# Altium footprint library Test.PcbLib: 245 footprints (part 11 of 17) (continued)
## QFN64LT-2 [mm] (continued)
3D body: height 0.76, standoff 0.75, extent -4.06,3.04 -3.04,4.06
3D body: height 0.75, standoff 0.01, extent -4.5,-4.5 4.5,4.5

## QFN64N [mm] "QFN, 64-Leads, Body 9,0x9,0mm (max), Pitch 0,50mm, IPC Medium Density"
height 1
pads (65):
  oval 0.85x0.28 smd mask+0.051: 1(-4.475,3.75) 2(-4.475,3.25) 3(-4.475,2.75) 4(-4.475,2.25) 5(-4.475,1.75) 6(-4.475,1.25) 7(-4.475,0.75) 8(-4.475,0.25) 9(-4.475,-0.25) 10(-4.475,-0.75) 11(-4.475,-1.25) 12(-4.475,-1.75) 13(-4.475,-2.25) 14(-4.475,-2.75) 15(-4.475,-3.25) 16(-4.475,-3.75) 33(4.475,-3.75) 34(4.475,-3.25) 35(4.475,-2.75) 36(4.475,-2.25) 37(4.475,-1.75) 38(4.475,-1.25) 39(4.475,-0.75) 40(4.475,-0.25) 41(4.475,0.25) 42(4.475,0.75) 43(4.475,1.25) 44(4.475,1.75) 45(4.475,2.25) 46(4.475,2.75) 47(4.475,3.25) 48(4.475,3.75)
  oval 0.28x0.85 smd mask+0.051: 17(-3.75,-4.475) 18(-3.25,-4.475) 19(-2.75,-4.475) 20(-2.25,-4.475) 21(-1.75,-4.475) 22(-1.25,-4.475) 23(-0.75,-4.475) 24(-0.25,-4.475) 25(0.25,-4.475) 26(0.75,-4.475) 27(1.25,-4.475) 28(1.75,-4.475) 29(2.25,-4.475) 30(2.75,-4.475) 31(3.25,-4.475) 32(3.75,-4.475) 49(3.75,4.475) 50(3.25,4.475) 51(2.75,4.475) 52(2.25,4.475) 53(1.75,4.475) 54(1.25,4.475) 55(0.75,4.475) 56(0.25,4.475) 57(-0.25,4.475) 58(-0.75,4.475) 59(-1.25,4.475) 60(-1.75,4.475) 61(-2.25,4.475) 62(-2.75,4.475) 63(-3.25,4.475) 64(-3.75,4.475)
  rect 7.4x7.4 smd paste-8 mask-8: 65(0,0)
via -3,3 diameter 0.65 hole 0.3
via -1.8,3 diameter 0.65 hole 0.3
via -0.6,3 diameter 0.65 hole 0.3
via 0.6,3 diameter 0.65 hole 0.3
via 1.8,3 diameter 0.65 hole 0.3
via 3,3 diameter 0.65 hole 0.3
via -3,1.8 diameter 0.65 hole 0.3
via -1.8,1.8 diameter 0.65 hole 0.3
via -0.6,1.8 diameter 0.65 hole 0.3
via 0.6,1.8 diameter 0.65 hole 0.3
via 1.8,1.8 diameter 0.65 hole 0.3
via 3,1.8 diameter 0.65 hole 0.3
via -3,0.6 diameter 0.65 hole 0.3
via -1.8,0.6 diameter 0.65 hole 0.3
via -0.6,0.6 diameter 0.65 hole 0.3
via 0.6,0.6 diameter 0.65 hole 0.3
via 1.8,0.6 diameter 0.65 hole 0.3
via 3,0.6 diameter 0.65 hole 0.3
via -3,-0.6 diameter 0.65 hole 0.3
via -1.8,-0.6 diameter 0.65 hole 0.3
via -0.6,-0.6 diameter 0.65 hole 0.3
via 0.6,-0.6 diameter 0.65 hole 0.3
via 1.8,-0.6 diameter 0.65 hole 0.3
via 3,-0.6 diameter 0.65 hole 0.3
via -3,-1.8 diameter 0.65 hole 0.3
via -1.8,-1.8 diameter 0.65 hole 0.3
via -0.6,-1.8 diameter 0.65 hole 0.3
via 0.6,-1.8 diameter 0.65 hole 0.3
via 1.8,-1.8 diameter 0.65 hole 0.3
via 3,-1.8 diameter 0.65 hole 0.3
via -3,-3 diameter 0.65 hole 0.3
via -1.8,-3 diameter 0.65 hole 0.3
via -0.6,-3 diameter 0.65 hole 0.3
via 0.6,-3 diameter 0.65 hole 0.3
via 1.8,-3 diameter 0.65 hole 0.3
via 3,-3 diameter 0.65 hole 0.3
Top Overlay:
  circle w0.25: c-5.45,3.75 r0.125
Top Paste:
  drawing of 49 lines, arcs and shapes, not listed
Top Solder:
  drawing of 36 lines, arcs and shapes, not listed
Mechanical 12:
  circle w0.4: c-3,3 r0.15
  circle w0.4: c-1.8,3 r0.15
  circle w0.4: c-0.6,3 r0.15
  circle w0.4: c0.6,3 r0.15
  circle w0.4: c1.8,3 r0.15
  circle w0.4: c3,3 r0.15
  circle w0.4: c-3,1.8 r0.15
  circle w0.4: c-1.8,1.8 r0.15
  circle w0.4: c-0.6,1.8 r0.15
  circle w0.4: c0.6,1.8 r0.15
  circle w0.4: c1.8,1.8 r0.15
  circle w0.4: c3,1.8 r0.15
  circle w0.4: c-3,0.6 r0.15
  circle w0.4: c-1.8,0.6 r0.15
  circle w0.4: c-0.6,0.6 r0.15
  circle w0.4: c0.6,0.6 r0.15
  circle w0.4: c1.8,0.6 r0.15
  circle w0.4: c3,0.6 r0.15
  circle w0.4: c-3,-0.6 r0.15
  circle w0.4: c-1.8,-0.6 r0.15
  circle w0.4: c-0.6,-0.6 r0.15
  circle w0.4: c0.6,-0.6 r0.15
  circle w0.4: c1.8,-0.6 r0.15
  circle w0.4: c3,-0.6 r0.15
  circle w0.4: c-3,-1.8 r0.15
  circle w0.4: c-1.8,-1.8 r0.15
  circle w0.4: c-0.6,-1.8 r0.15
  circle w0.4: c0.6,-1.8 r0.15
  circle w0.4: c1.8,-1.8 r0.15
  circle w0.4: c3,-1.8 r0.15
  circle w0.4: c-3,-3 r0.15
  circle w0.4: c-1.8,-3 r0.15
  circle w0.4: c-0.6,-3 r0.15
  circle w0.4: c0.6,-3 r0.15
  circle w0.4: c1.8,-3 r0.15
  circle w0.4: c3,-3 r0.15
Mechanical 13:
  circle w0.1: c-3.55,3.55 r0.5
  lines w0.1: -4.5,-4.5 -4.5,4.5 4.5,4.5 4.5,-4.5 -4.5,-4.5
Mechanical 15:
  lines w0.1: -0.5,0 0.5,0 ; 0,-0.5 0,0.5 ; -5.1,-5.1 -5.1,5.1 5.1,5.1 5.1,-5.1 -5.1,-5.1
3D body: height 1.01, standoff 1, extent -4.035,3.065 -3.015,4.085
3D body: height 1, standoff 0.01, extent -4.5,-4.5 4.5,4.5

## QFN65P400X400X100-16N [mm] "QFN 4x4mm 16pin R0.65mm"
height 1
pads (17):
  oval 0.75x0.35 smd mask+0.051: 1(-2,0.975) 2(-2,0.325) 3(-2,-0.325) 4(-2,-0.975) 9(2,-0.975) 10(2,-0.325) 11(2,0.325) 12(2,0.975)
  oval 0.35x0.75 smd mask+0.051: 5(-0.975,-2) 6(-0.325,-2) 7(0.325,-2) 8(0.975,-2) 13(0.975,2) 14(0.325,2) 15(-0.325,2) 16(-0.975,2)
  rect 2.7x2.7 smd paste-5 mask-5: 17(0,0)
via -0.6,0.6 diameter 0.65 hole 0.3
via 0.6,0.6 diameter 0.65 hole 0.3
via -0.6,-0.6 diameter 0.65 hole 0.3
via 0.6,-0.6 diameter 0.65 hole 0.3
Top Overlay:
  circle w0.25: c-2.425,1.7 r0.125
  lines w0.15: -2,-1.55 -2,-2 -1.55,-2 ; -2,1.55 -2,2 -1.55,2 ; 1.55,-2 2,-2 2,-1.55 ; 1.55,2 2,2 2,1.55
Top Paste:
  region: 1.325,1.325 1.325,0.75 0.925,0.75 0.75,0.925 0.75,1.325
  region: 0.45,1.325 0.45,0.925 0.275,0.75 -0.275,0.75 -0.45,0.925 -0.45,1.325
  region: 1.325,-1.325 0.75,-1.325 0.75,-0.925 0.925,-0.75 1.325,-0.75
  region: 1.325,-0.45 0.925,-0.45 0.75,-0.275 0.75,0.275 0.925,0.45 1.325,0.45
  region: -1.325,-1.325 -1.325,-0.75 -0.925,-0.75 -0.75,-0.925 -0.75,-1.325
  region: -0.45,-1.325 -0.45,-0.925 -0.275,-0.75 0.275,-0.75 0.45,-0.925 0.45,-1.325
  region: -0.45,0.275 -0.275,0.45 0.275,0.45 0.45,0.275 0.45,-0.275 0.275,-0.45 -0.275,-0.45 -0.45,-0.275
  region: -1.325,0.45 -0.925,0.45 -0.75,0.275 -0.75,-0.275 -0.925,-0.45 -1.325,-0.45
  region: -1.325,1.325 -0.75,1.325 -0.75,0.925 -0.925,0.75 -1.325,0.75
Top Solder:
  region: 1.4,1.4 0.6,1.4 0.6,0.931 0.473,0.906 0.366,0.834 0.294,0.727 0.269,0.6 0.275,0.6 0.269,0.6 0.294,0.473 0.366,0.366 0.473,0.294 0.6,0.269 0.6,0.275 0.6,0.269 0.727,0.294 0.834,0.366 0.906,0.473 0.931,0.6 0.906,0.727 0.834,0.834 0.727,0.906 0.6,0.931 0.6,0.925 0.6,1.4 0,1.4 0,0 1.4,0
  region: 1.4,-1.4 1.4,-0.6 0.931,-0.6 0.906,-0.473 0.834,-0.366 0.727,-0.294 0.6,-0.269 0.6,-0.275 0.6,-0.269 0.473,-0.294 0.366,-0.366 0.294,-0.473 0.269,-0.6 0.275,-0.6 0.269,-0.6 0.294,-0.727 0.366,-0.834 0.473,-0.906 0.6,-0.931 0.727,-0.906 0.834,-0.834 0.906,-0.727 0.931,-0.6 0.925,-0.6 1.4,-0.6 1.4,0 0,0 0,-1.4
  region: -1.4,-1.4 -0.6,-1.4 -0.6,-0.931 -0.473,-0.906 -0.366,-0.834 -0.294,-0.727 -0.269,-0.6 -0.275,-0.6 -0.269,-0.6 -0.294,-0.473 -0.366,-0.366 -0.473,-0.294 -0.6,-0.269 -0.6,-0.275 -0.6,-0.269 -0.727,-0.294 -0.834,-0.366 -0.906,-0.473 -0.931,-0.6 -0.906,-0.727 -0.834,-0.834 -0.727,-0.906 -0.6,-0.931 -0.6,-0.925 -0.6,-1.4 0,-1.4 0,0 -1.4,0
  region: -1.4,1.4 -1.4,0.6 -0.931,0.6 -0.906,0.473 -0.834,0.366 -0.727,0.294 -0.6,0.269 -0.6,0.275 -0.6,0.269 -0.473,0.294 -0.366,0.366 -0.294,0.473 -0.269,0.6 -0.275,0.6 -0.269,0.6 -0.294,0.727 -0.366,0.834 -0.473,0.906 -0.6,0.931 -0.727,0.906 -0.834,0.834 -0.906,0.727 -0.931,0.6 -0.925,0.6 -1.4,0.6 -1.4,0 0,0 0,1.4
Mechanical 12:
  circle w0.4: c-0.6,0.6 r0.15
  circle w0.4: c0.6,0.6 r0.15
  circle w0.4: c-0.6,-0.6 r0.15
  circle w0.4: c0.6,-0.6 r0.15
Mechanical 13:
  circle w0.1: c-1.25,1.3 r0.35
  lines w0.1: -2,-2 -2,2 2,2 2,-2 -2,-2
Mechanical 15:
  lines w0.1: -0.5,0 0.5,0 ; 0,-0.5 0,0.5 ; -2.8,-2.8 -2.8,2.8 2.8,2.8 2.8,-2.8 -2.8,-2.8
3D body: height 1, standoff 0.01, extent -2,-2 2,2
3D body: height 1.01, standoff 1, extent -1.607,0.943 -0.893,1.657

## QFN65P400X400X100-16N2 [mm] "QFN, 16-Leads, Body 4,0x4,0mm (max), Pitch 0,65mm, IPC Medium Density"
height 1
pads (17):
  oval 0.8x0.35 smd mask+0.051: 1(-1.95,0.975) 2(-1.95,0.325) 3(-1.95,-0.325) 4(-1.95,-0.975) 9(1.95,-0.975) 10(1.95,-0.325) 11(1.95,0.325) 12(1.95,0.975)
  oval 0.35x0.8 smd mask+0.051: 5(-0.975,-1.95) 6(-0.325,-1.95) 7(0.325,-1.95) 8(0.975,-1.95) 13(0.975,1.95) 14(0.325,1.95) 15(-0.325,1.95) 16(-0.975,1.95)
  rect 2.1x2.1 smd paste-7 mask-7: 17(0,0)
via -0.6,0.6 diameter 0.6 hole 0.3
via 0.6,0.6 diameter 0.6 hole 0.3
via -0.6,-0.6 diameter 0.6 hole 0.3
via 0.6,-0.6 diameter 0.6 hole 0.3
Top Overlay:
  circle w0.25: c-2.9,0.975 r0.125
  lines w0.15: -2,-1.55 -1.55,-2 ; -2,1.55 -1.55,2 ; 1.55,-2 2,-1.55 ; 1.55,2 2,1.55
Top Paste:
  region: -0.525,0.3 -0.3,0.525 0.3,0.525 0.525,0.3 0.525,-0.3 0.3,-0.525 -0.3,-0.525 -0.525,-0.3
  region: -0.525,1.025 -0.525,0.9 -0.3,0.675 0.3,0.675 0.525,0.9 0.525,1.025
  region: 1.025,-0.525 0.9,-0.525 0.675,-0.3 0.675,0.3 0.9,0.525 1.025,0.525
  region: -0.525,-1.025 -0.525,-0.9 -0.3,-0.675 0.3,-0.675 0.525,-0.9 0.525,-1.025
  region: -1.025,-0.525 -0.9,-0.525 -0.675,-0.3 -0.675,0.3 -0.9,0.525 -1.025,0.525
  region: -1.025,-0.75 -1.025,-1.025 -0.75,-1.025 -0.75,-0.85 -0.85,-0.75
  region: 0.75,-1.025 1.025,-1.025 1.025,-0.75 0.85,-0.75 0.75,-0.85
  region: 1.025,0.75 1.025,1.025 0.75,1.025 0.75,0.85 0.85,0.75
  region: -0.75,1.025 -1.025,1.025 -1.025,0.75 -0.85,0.75 -0.75,0.85
Top Solder:
  circle w0.102: c-0.6,0.6 r0.356
  circle w0.102: c0.6,0.6 r0.356
  circle w0.102: c0.6,-0.6 r0.356
  circle w0.102: c-0.6,-0.6 r0.356
  region: -1.1,1.1 0,1.1 0,0 -0.6,0 -0.6,0.225 -0.525,0.225 -0.45,0.3 -0.4,0.3 -0.275,0.425 -0.275,0.569 -0.244,0.6 -0.275,0.631 -0.275,0.775 -0.425,0.925 -0.625,0.925 -0.65,0.95 -0.675,0.925 -0.8,0.925 -0.925,0.8 -0.925,0.65 -0.95,0.625 -0.95,0.475 -0.85,0.375 -0.85,0.35 -0.825,0.35 -0.7,0.225 -0.6,0.225 -0.6,0 -1.1,0
  region: 1.1,1.1 0,1.1 0,0 0.6,0 0.6,0.225 0.525,0.225 0.45,0.3 0.4,0.3 0.275,0.425 0.275,0.569 0.244,0.6 0.275,0.631 0.275,0.775 0.425,0.925 0.625,0.925 0.65,0.95 0.675,0.925 0.8,0.925 0.925,0.8 0.925,0.65 0.95,0.625 0.95,0.475 0.85,0.375 0.85,0.35 0.825,0.35 0.7,0.225 0.6,0.225 0.6,0 1.1,0
  region: 1.1,-1.1 0,-1.1 0,0 0.6,0 0.6,-0.225 0.525,-0.225 0.45,-0.3 0.4,-0.3 0.275,-0.425 0.275,-0.569 0.244,-0.6 0.275,-0.631 0.275,-0.775 0.425,-0.925 0.625,-0.925 0.65,-0.95 0.675,-0.925 0.8,-0.925 0.925,-0.8 0.925,-0.65 0.95,-0.625 0.95,-0.475 0.85,-0.375 0.85,-0.35 0.825,-0.35 0.7,-0.225 0.6,-0.225 0.6,0 1.1,0
  region: -1.1,-1.1 0,-1.1 0,0 -0.6,0 -0.6,-0.225 -0.525,-0.225 -0.45,-0.3 -0.4,-0.3 -0.275,-0.425 -0.275,-0.569 -0.244,-0.6 -0.275,-0.631 -0.275,-0.775 -0.425,-0.925 -0.625,-0.925 -0.65,-0.95 -0.675,-0.925 -0.8,-0.925 -0.925,-0.8 -0.925,-0.65 -0.95,-0.625 -0.95,-0.475 -0.85,-0.375 -0.85,-0.35 -0.825,-0.35 -0.7,-0.225 -0.6,-0.225 -0.6,0 -1.1,0
Mechanical 12:
  circle w0.4: c-0.6,0.6 r0.15
  circle w0.4: c0.6,0.6 r0.15
  circle w0.4: c-0.6,-0.6 r0.15
  circle w0.4: c0.6,-0.6 r0.15
Mechanical 13:
  circle w0.1: c-1.25,1.3 r0.35
  lines w0.1: -2,-1.4 -1.4,-2 1.4,-2 2,-1.4 2,1.4 1.4,2 -1.4,2 -2,1.4 -2,-1.4
Mechanical 15:
  lines w0.1: -0.5,0 0.5,0 ; 0,-0.5 0,0.5 ; -2.6,-1.6 -1.6,-2.6 1.575,-2.6 2.6,-1.575 2.6,1.6 1.6,2.6 -1.6,2.6 -2.6,1.6 -2.6,-1.6
3D body: height 1, standoff 0.02, extent -2,-2 2,2
3D body: height 1.01, standoff 1, extent -1.607,0.943 -0.893,1.657

## QFN65P500X500X100-20M [mm] "QFN, 20-Leads, Body 5,0x5,0mm (max), Pitch 0,65mm, IPC Low Density"
height 1
pads (21):
  oval 0.9x0.35 smd mask+0.051: 1(-2.5,1.3) 2(-2.5,0.65) 3(-2.5,0) 4(-2.5,-0.65) 5(-2.5,-1.3) 11(2.5,-1.3) 12(2.5,-0.65) 13(2.5,0) 14(2.5,0.65) 15(2.5,1.3)
  oval 0.35x0.9 smd mask+0.051: 6(-1.3,-2.5) 7(-0.65,-2.5) 8(0,-2.5) 9(0.65,-2.5) 10(1.3,-2.5) 16(1.3,2.5) 17(0.65,2.5) 18(0,2.5) 19(-0.65,2.5) 20(-1.3,2.5)
  rect 3.3x3.3 smd paste-5 mask-5: 21(0,0)
via 1.2,-1.2 diameter 0.65 hole 0.3
via 0,-1.2 diameter 0.65 hole 0.3
via -1.2,-1.2 diameter 0.65 hole 0.3
via 1.2,0 diameter 0.65 hole 0.3
via 0,0 diameter 0.65 hole 0.3
via -1.2,0 diameter 0.65 hole 0.3
via 1.2,1.2 diameter 0.65 hole 0.3
via 0,1.2 diameter 0.65 hole 0.3
via -1.2,1.2 diameter 0.65 hole 0.3
Top Overlay:
  circle w0.25: c-2.944,2.007 r0.125
  lines w0.15: -2.5,-2.05 -2.5,-2.5 -2.05,-2.5 ; -2.5,2.05 -2.5,2.5 -2.05,2.5 ; 2.05,-2.5 2.5,-2.5 2.5,-2.05 ; 2.05,2.5 2.5,2.5 2.5,2.05
Top Paste:
  region: -0.875,1.05 -1.05,0.875 -1.05,0.325 -0.875,0.15 -0.325,0.15 -0.15,0.325 -0.15,0.875 -0.325,1.05
  region: -1.625,0.15 -1.525,0.15 -1.35,0.325 -1.35,0.875 -1.525,1.05 -1.625,1.05
  region: -1.35,1.525 -1.525,1.35 -1.625,1.35 -1.625,1.625 -1.35,1.625
  region: -1.525,-1.35 -1.35,-1.525 -1.35,-1.625 -1.625,-1.625 -1.625,-1.35
  region: 1.35,-1.525 1.525,-1.35 1.625,-1.35 1.625,-1.625 1.35,-1.625
  region: 1.525,1.35 1.35,1.525 1.35,1.625 1.625,1.625 1.625,1.35
  region: -1.625,-1.05 -1.525,-1.05 -1.35,-0.875 -1.35,-0.325 -1.525,-0.15 -1.625,-0.15
  region: 1.05,-1.625 1.05,-1.525 0.875,-1.35 0.325,-1.35 0.15,-1.525 0.15,-1.625
  region: -0.15,-1.625 -0.15,-1.525 -0.325,-1.35 -0.875,-1.35 -1.05,-1.525 -1.05,-1.625
  region: 1.625,1.05 1.525,1.05 1.35,0.875 1.35,0.325 1.525,0.15 1.625,0.15
  region: 1.625,-0.15 1.525,-0.15 1.35,-0.325 1.35,-0.875 1.525,-1.05 1.625,-1.05
  region: -1.05,1.625 -1.05,1.525 -0.875,1.35 -0.325,1.35 -0.15,1.525 -0.15,1.625
  region: 0.15,1.625 0.15,1.525 0.325,1.35 0.875,1.35 1.05,1.525 1.05,1.625
  region: 0.325,1.05 0.15,0.875 0.15,0.325 0.325,0.15 0.875,0.15 1.05,0.325 1.05,0.875 0.875,1.05
  region: 0.325,-0.15 0.15,-0.325 0.15,-0.875 0.325,-1.05 0.875,-1.05 1.05,-0.875 1.05,-0.325 0.875,-0.15
  region: -0.875,-0.15 -1.05,-0.325 -1.05,-0.875 -0.875,-1.05 -0.325,-1.05 -0.15,-0.875 -0.15,-0.325 -0.325,-0.15
Top Solder:
  drawing of 9 lines, arcs and shapes, not listed
Mechanical 13:
  circle w0.1: c-1.55,1.55 r0.5
  lines w0.1: -2.5,-2.5 2.5,-2.5 2.5,2.5 -2.5,2.5 -2.5,-2.5
Mechanical 15:
  lines w0.1: -0.5,0 0.5,0 ; 0,-0.5 0,0.5 ; -3.2,-3.2 3.2,-3.2 3.2,3.2 -3.2,3.2 -3.2,-3.2
3D body: height 1.01, standoff 1, extent -2.06,1.04 -1.04,2.06
3D body: height 1, standoff 0.02, extent -2.5,-2.5 2.5,2.5

## QFN65P600X600X100-28N [mm] "QFN, 28-Leads, Body 6,0x6,0mm (max), Pitch 0,65mm, IPC Medium Density"
height 1
pads (29):
  oval 0.65x0.35 smd mask+0.051: 1(-3.025,1.95) 2(-3.025,1.3) 3(-3.025,0.65) 4(-3.025,0) 5(-3.025,-0.65) 6(-3.025,-1.3) 7(-3.025,-1.95) 15(3.025,-1.95) 16(3.025,-1.3) 17(3.025,-0.65) 18(3.025,0) 19(3.025,0.65) 20(3.025,1.3) 21(3.025,1.95)
  oval 0.35x0.65 smd mask+0.051: 8(-1.95,-3.025) 9(-1.3,-3.025) 10(-0.65,-3.025) 11(0,-3.025) 12(0.65,-3.025) 13(1.3,-3.025) 14(1.95,-3.025) 22(1.95,3.025) 23(1.3,3.025) 24(0.65,3.025) 25(0,3.025) 26(-0.65,3.025) 27(-1.3,3.025) 28(-1.95,3.025)
  rect 4.7x4.7 smd paste-5 mask-5: 29(0,0)
via 0.6,-1.8 diameter 0.6 hole 0.3
via -0.6,-1.8 diameter 0.6 hole 0.3
via -1.8,-1.8 diameter 0.6 hole 0.3
via 1.8,-0.6 diameter 0.6 hole 0.3
via 0.6,-0.6 diameter 0.6 hole 0.3
via -0.6,-0.6 diameter 0.6 hole 0.3
via -1.8,-0.6 diameter 0.6 hole 0.3
via 1.8,0.6 diameter 0.6 hole 0.3
via 0.6,0.6 diameter 0.6 hole 0.3
via -1.8,0.6 diameter 0.6 hole 0.3
via 1.8,1.8 diameter 0.6 hole 0.3
via 0.6,1.8 diameter 0.6 hole 0.3
via -0.6,1.8 diameter 0.6 hole 0.3
via -1.8,1.8 diameter 0.6 hole 0.3
via -0.6,0.6 diameter 0.6 hole 0.3
via 1.8,-1.8 diameter 0.6 hole 0.3
Top Overlay:
  circle w0.25: c-3.45,2.575 r0.125
  lines w0.15: -3,-2.55 -3,-3 -2.55,-3 ; -3,2.55 -3,3 -2.55,3 ; 2.55,-3 3,-3 3,-2.55 ; 2.55,3 3,3 3,2.55
Top Paste:
  drawing of 25 lines, arcs and shapes, not listed
Top Solder:
  drawing of 2 lines, arcs and shapes, not listed
Mechanical 13:
  circle w0.1: c-2.05,2.05 r0.5
  lines w0.1: -3,-3 3,-3 3,3 -3,3 -3,-3
Mechanical 15:
  lines w0.1: -0.5,0 0.5,0 ; 0,-0.5 0,0.5 ; -3.6,-3.6 3.6,-3.6 3.6,3.6 -3.6,3.6 -3.6,-3.6
3D body: height 1, standoff 0.02, extent -3,-3 3,3
3D body: height 1.01, standoff 1, extent -2.56,1.54 -1.54,2.56

## QFP64A_M [mm] "Thin QFP, 64-Leads, Body 14x14mm, Pitch 0.8mm, IPC Low Density"
height 1.2
pads (64):
  rrect35% 2.05x0.533 smd mask+0.051: 1(-7.7,6)
  oval 2.05x0.533 smd mask+0.051: 2(-7.7,5.2) 3(-7.7,4.4) 4(-7.7,3.6) 5(-7.7,2.8) 6(-7.7,2) 7(-7.7,1.2) 8(-7.7,0.4) 9(-7.7,-0.4) 10(-7.7,-1.2) 11(-7.7,-2) 12(-7.7,-2.8) 13(-7.7,-3.6) 14(-7.7,-4.4) 15(-7.7,-5.2) 16(-7.7,-6) 33(7.7,-6) 34(7.7,-5.2) 35(7.7,-4.4) 36(7.7,-3.6) 37(7.7,-2.8) 38(7.7,-2) 39(7.7,-1.2) 40(7.7,-0.4) 41(7.7,0.4) 42(7.7,1.2) 43(7.7,2) 44(7.7,2.8) 45(7.7,3.6) 46(7.7,4.4) 47(7.7,5.2) 48(7.7,6)
  oval 0.533x2.05 smd mask+0.051: 17(-6,-7.7) 18(-5.2,-7.7) 19(-4.4,-7.7) 20(-3.6,-7.7) 21(-2.8,-7.7) 22(-2,-7.7) 23(-1.2,-7.7) 24(-0.4,-7.7) 25(0.4,-7.7) 26(1.2,-7.7) 27(2,-7.7) 28(2.8,-7.7) 29(3.6,-7.7) 30(4.4,-7.7) 31(5.2,-7.7) 32(6,-7.7) 49(6,7.7) 50(5.2,7.7) 51(4.4,7.7) 52(3.6,7.7) 53(2.8,7.7) 54(2,7.7) 55(1.2,7.7) 56(0.4,7.7) 57(-0.4,7.7) 58(-1.2,7.7) 59(-2,7.7) 60(-2.8,7.7) 61(-3.6,7.7) 62(-4.4,7.7) 63(-5.2,7.7) 64(-6,7.7)
Top Overlay:
  circle w0.25: c-7.7,6.85 r0.125
  circle w0.6: c-5.25,5.25 r0.3
  lines w0.2: -6.25,-6.25 -6.25,6.25 6.25,6.25 6.25,-6.25 -6.25,-6.25
Mechanical 13:
  circle w0.1: c-6.1,6.1 r0.5
  lines w0.1: -7,-7 -7,7 7,7 7,-7 -7,-7
Mechanical 15:
  lines w0.1: -0.5,0 0.5,0 ; 0,-0.5 0,0.5 ; -9.2,-9.2 -9.2,9.2 9.2,9.2 9.2,-9.2 -9.2,-9.2
3D body: height 1.2, standoff 0, extent -7,-7 7,7

## QFP80_M [mm] "QFP, 80-Leads, Body 14 x 14mm, Pitch 0.65mm, IPC Low Density"
height 2.45
pads (81):
  oval 2.25x0.43 smd mask+0.051: 1(-8.2,6.175) 2(-8.2,5.525) 3(-8.2,4.875) 4(-8.2,4.225) 5(-8.2,3.575) 6(-8.2,2.925) 7(-8.2,2.275) 8(-8.2,1.625) 9(-8.2,0.975) 10(-8.2,0.325) 11(-8.2,-0.325) 12(-8.2,-0.975) 13(-8.2,-1.625) 14(-8.2,-2.275) 15(-8.2,-2.925) 16(-8.2,-3.575) 17(-8.2,-4.225) 18(-8.2,-4.875) 19(-8.2,-5.525) 20(-8.2,-6.175) 41(8.2,-6.175) 42(8.2,-5.525) 43(8.2,-4.875) 44(8.2,-4.225) 45(8.2,-3.575) 46(8.2,-2.925) 47(8.2,-2.275) 48(8.2,-1.625) 49(8.2,-0.975) 50(8.2,-0.325) 51(8.2,0.325) 52(8.2,0.975) 53(8.2,1.625) 54(8.2,2.275) 55(8.2,2.925) 56(8.2,3.575) 57(8.2,4.225) 58(8.2,4.875) 59(8.2,5.525) 60(8.2,6.175)
  oval 0.43x2.25 smd mask+0.051: 21(-6.175,-8.2) 22(-5.525,-8.2) 23(-4.875,-8.2) 24(-4.225,-8.2) 25(-3.575,-8.2) 26(-2.925,-8.2) 27(-2.275,-8.2) 28(-1.625,-8.2) 29(-0.975,-8.2) 30(-0.325,-8.2) 31(0.325,-8.2) 32(0.975,-8.2) 33(1.625,-8.2) 34(2.275,-8.2) 35(2.925,-8.2) 36(3.575,-8.2) 37(4.225,-8.2) 38(4.875,-8.2) 39(5.525,-8.2) 40(6.175,-8.2) 61(6.175,8.2) 62(5.525,8.2) 63(4.875,8.2) 64(4.225,8.2) 65(3.575,8.2) 66(2.925,8.2) 67(2.275,8.2) 68(1.625,8.2) 69(0.975,8.2) 70(0.325,8.2) 71(-0.325,8.2) 72(-0.975,8.2) 73(-1.625,8.2) 74(-2.275,8.2) 75(-2.925,8.2) 76(-3.575,8.2) 77(-4.225,8.2) 78(-4.875,8.2) 79(-5.525,8.2) 80(-6.175,8.2)
  oct 10.16x10.16 smd paste-20 mask-20: 81(0,0)
via -3,-4.2 diameter 0.65 hole 0.3
via -4.2,-3 diameter 0.65 hole 0.3
via -4.2,3 diameter 0.65 hole 0.3
via -3,4.2 diameter 0.65 hole 0.3
via 3,4.2 diameter 0.65 hole 0.3
via 4.2,3 diameter 0.65 hole 0.3
via 4.2,-3 diameter 0.65 hole 0.3
via 3,-4.2 diameter 0.65 hole 0.3
via 0.6,-0.6 diameter 0.65 hole 0.3
via 0.6,-4.2 diameter 0.65 hole 0.3
via 0.6,-3 diameter 0.65 hole 0.3
via 0.6,-1.8 diameter 0.65 hole 0.3
via 0.6,4.2 diameter 0.65 hole 0.3
via 0.6,3 diameter 0.65 hole 0.3
via 0.6,1.8 diameter 0.65 hole 0.3
via 0.6,0.6 diameter 0.65 hole 0.3
via -1.8,-0.6 diameter 0.65 hole 0.3
via -1.8,-4.2 diameter 0.65 hole 0.3
via -1.8,-3 diameter 0.65 hole 0.3
via -1.8,-1.8 diameter 0.65 hole 0.3
via -1.8,4.2 diameter 0.65 hole 0.3
via -1.8,3 diameter 0.65 hole 0.3
via -1.8,1.8 diameter 0.65 hole 0.3
via -1.8,0.6 diameter 0.65 hole 0.3
via -3,0.6 diameter 0.65 hole 0.3
via -3,-3 diameter 0.65 hole 0.3
via -3,-1.8 diameter 0.65 hole 0.3
via -3,-0.6 diameter 0.65 hole 0.3
via -3,3 diameter 0.65 hole 0.3
via -3,1.8 diameter 0.65 hole 0.3
via -4.2,1.8 diameter 0.65 hole 0.3
via -4.2,-1.8 diameter 0.65 hole 0.3
via -4.2,-0.6 diameter 0.65 hole 0.3
via -4.2,0.6 diameter 0.65 hole 0.3
via -0.6,-0.6 diameter 0.65 hole 0.3
via -0.6,-4.2 diameter 0.65 hole 0.3
via -0.6,-3 diameter 0.65 hole 0.3
via -0.6,-1.8 diameter 0.65 hole 0.3
via -0.6,4.2 diameter 0.65 hole 0.3
via -0.6,3 diameter 0.65 hole 0.3
via -0.6,1.8 diameter 0.65 hole 0.3
via -0.6,0.6 diameter 0.65 hole 0.3
via 4.2,0.6 diameter 0.65 hole 0.3
via 4.2,-0.6 diameter 0.65 hole 0.3
via 4.2,-1.8 diameter 0.65 hole 0.3
via 4.2,1.8 diameter 0.65 hole 0.3
via 3,1.8 diameter 0.65 hole 0.3
via 3,3 diameter 0.65 hole 0.3
via 3,-0.6 diameter 0.65 hole 0.3
via 3,-1.8 diameter 0.65 hole 0.3
via 3,-3 diameter 0.65 hole 0.3
via 3,0.6 diameter 0.65 hole 0.3
via 1.8,0.6 diameter 0.65 hole 0.3
via 1.8,1.8 diameter 0.65 hole 0.3
via 1.8,3 diameter 0.65 hole 0.3
via 1.8,4.2 diameter 0.65 hole 0.3
via 1.8,-1.8 diameter 0.65 hole 0.3
via 1.8,-3 diameter 0.65 hole 0.3
via 1.8,-4.2 diameter 0.65 hole 0.3
via 1.8,-0.6 diameter 0.65 hole 0.3
Top Overlay:
  circle w0.25: c-8.2,6.95 r0.125
  circle w0.6: c-5.65,5.65 r0.3
  lines w0.127: -6.65,-6.65 -6.65,6.65 6.65,6.65 6.65,-6.65 -6.65,-6.65
Top Paste:
  drawing of 69 lines, arcs and shapes, not listed
Top Solder:
  drawing of 56 lines, arcs and shapes, not listed
Mechanical 13:
  circle w0.1: c-6.1,6.1 r0.5
  lines w0.1: -7,-7 -7,7 7,7 7,-7 -7,-7
Mechanical 15:
  lines w0.1: -0.5,0 0.5,0 ; 0,-0.5 0,0.5 ; -9.8,-9.8 -9.8,9.8 9.8,9.8 9.8,-9.8 -9.8,-9.8
3D body: height 2.45, standoff 0, extent -7,-7 7,7

## QSOP16 [mm] "SSOP; 16 Leads; Body Width 3.9 mm; Pitch 0.635 mm"
height 1.76
pads (16):
  oval 1.6x0.35 smd: 1(-2.667,2.222) 2(-2.667,1.587) 3(-2.667,0.953) 4(-2.667,0.318) 5(-2.667,-0.318) 6(-2.667,-0.953) 7(-2.667,-1.587) 8(-2.667,-2.222) 9(2.667,-2.222) 10(2.667,-1.587) 11(2.667,-0.953) 12(2.667,-0.318) 13(2.667,0.318) 14(2.667,0.953) 15(2.667,1.587) 16(2.667,2.222)
Top Overlay:
  circle w0.254: c-2.667,2.919 r0.102
  lines w0.102: -0.508,2.667 ccw(c0,2.667) 0.508,2.667 ; -1.397,-2.667 -1.397,2.667 1.397,2.667 1.397,-2.667 -1.397,-2.667
Mechanical 13:
  circle w0.102: c-1.397,1.935 r0.284
  lines w0.102: -1.905,-2.54 -1.905,2.54 1.905,2.54 1.905,-2.54 -1.905,-2.54
Mechanical 15:
  lines w0.102: -0.381,0 0.381,0 ; 0,-0.381 0,0.381 ; -3.81,-2.794 -3.81,2.794 3.81,2.794 3.81,-2.794 -3.81,-2.794
3D body: height 1.51, standoff 1.5, extent -1.682,1.646 -1.112,2.215
3D body: height 1.5, standoff 0, extent -1.905,-2.54 1.905,2.54

## SC70 [mm] "3-Leads, Body 2,0x2,1mm (max), Pitch 0,65mm, IPC Medium Density"
height 1.1
pads (3):
  rrect50% 0.8x0.35 smd: 1(-0.98,0.65)
  oval 0.8x0.35 smd: 2(-0.98,-0.65) 3(0.98,0)
Top Overlay:
  lines w0.15: -0.2,-1 0.2,-1 0.2,1 -0.2,1 -0.2,-1
Mechanical 13:
  lines w0.1: -0.625,-1 -0.625,1 0.625,1 0.625,-1 -0.625,-1
Mechanical 15:
  lines w0.1: -0.5,0 0.5,0 ; 0,-0.5 0,0.5 ; -1.6,-1.25 -1.6,1.25 1.6,1.25 1.6,-1.25 -1.6,-1.25
3D body: height 1.1, standoff 0.1, extent -0.625,-1 0.625,1